# Altium footprint library MyPcbLib.PcbLib: 657 footprints (part 32 of 42)
Each footprint in its own frame and in the unit in brackets; x right, y up, seen from the top. Pads: shape width x height; smd on the part's side, far side on the other; paste and mask are expansions set on the pad; w line width, h text height; cw(c..) or ccw(c..) is an arc to the next point about the centre after c.
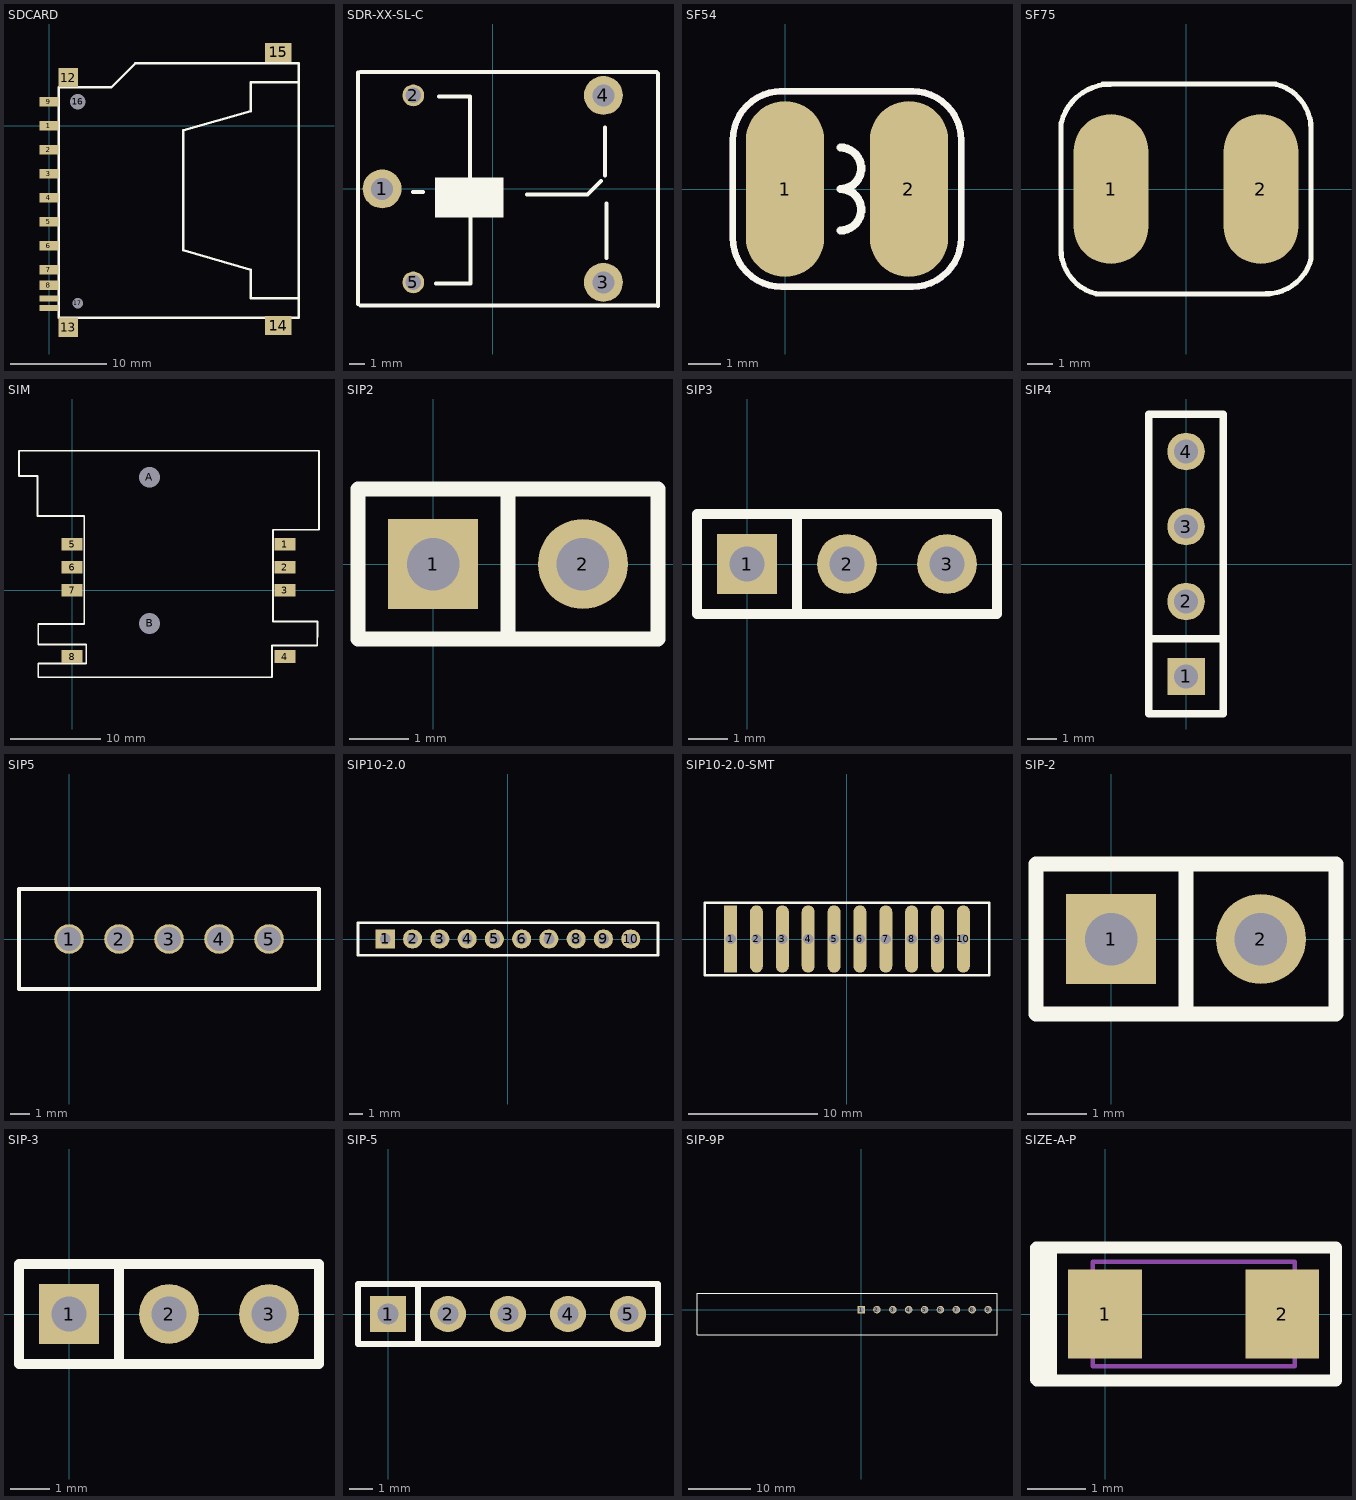
[diagram p31: the footprints below, top view; thin cyan lines are the x and y axes]

## SDCARD [mm]
pads (17):
  rect 2x1 smd: 1(-0.002,0.003) 2(-0.002,-2.497) 3(-0.002,-4.997) 4(-0.002,-7.497) 5(-0.002,-9.997) 6(-0.002,-12.497) 7(-0.002,-14.997) 8(-0.002,-16.622) 9(-0.002,2.503)
  rect 2x0.6 smd: 10(-0.002,-18.997) 11(-0.002,-17.997)
  rect 2x2 smd: 12(1.998,5.003) 13(1.998,-20.997)
  rect 2.8x2 smd: 14(23.874,-20.825) 15(23.874,7.623)
  round 1.5 hole 1.6: 16(2.998,2.503)
  round 1 hole 1.1: 17(2.998,-18.497)
Top Overlay:
  lines w0.254: 25.998,-17.997 20.998,-17.997 20.998,-14.997 13.998,-12.997 13.998,-0.497 20.998,1.503 20.998,4.503 25.998,4.503 ; 0.998,-19.997 25.998,-19.997 25.998,6.503 8.998,6.503 6.498,4.003 0.998,4.003 0.998,-19.997

## SDR-XX-SL-C [mm]
pads (5):
  round 2.5 hole 1.4: 1(-7.1,0) 3(7.1,-6) 4(7.1,6)
  round 1.4 hole 1: 2(-5.1,6) 5(-5.1,-6)
Top Overlay:
  rectangle: -3.708,-1.854 0.686,0.737
  lines w0.254: -8.649,-7.391 -8.649,7.468 ; -8.5,-7.5 10.5,-7.5 ; -8.5,7.5 10.5,7.5 ; -5.131,-0.203 -4.47,-0.203 ; -3.658,-6.071 -1.422,-6.071 -1.422,-1.168 ; -3.454,5.918 -1.473,5.918 -1.473,0.483 ; 2.184,-0.356 5.436,-0.356 ; 5.512,-0.356 6.071,-0.356 6.934,0.508 ; 7.214,0.864 7.214,3.937 ; 7.29,-4.445 7.29,-0.94 ; 10.604,-7.518 10.604,7.417
3D body: height 2.4, standoff -15.9, extent -8.661,-7.753 10.439,7.747

## SF54 [mm]
pads (2):
  oval 2.4x5.4 smd: 1(0,0) 2(3.8,0)
Top Overlay:
  lines w0.2: -1.6,-1.5 ccw(c-0.1,-1.5) -0.1,-3 3.9,-3 ; -1.6,1.5 cw(c-0.1,1.5) -0.1,3 ; 3.9,-2.999 ccw(c3.9,-1.5) 5.399,-1.5 ; 3.9,3 cw(c3.9,1.5) 5.4,1.5 5.4,-1.5
  lines w0.203: -1.6,-1.5 -1.6,1.5 ; -0.15,3 3.914,3
  lines w0.254: 1.7,-1.27 ccw(c1.7,-0.635) 1.7,0 ccw(c1.7,0.635) 1.7,1.27
Mechanical 1:
  lines w0.2: -1.6,-1.5 ccw(c-0.1,-1.5) -0.1,-3 3.9,-3 ; -1.6,1.5 cw(c-0.1,1.5) -0.1,3 ; 3.9,-2.999 ccw(c3.9,-1.5) 5.399,-1.5 ; 3.9,3 cw(c3.9,1.5) 5.4,1.5 5.4,-1.5
  lines w0.203: -1.6,-1.5 -1.6,1.5 ; -0.15,3 3.914,3

## SF75 [mm]
pads (2):
  oval 3x6 smd: 1(-3,0) 2(3,0)
Top Overlay:
  lines w0.2: -5.004,2.642 -5,-2.456 ; 5,-2.759 5,2.383
  lines w0.203: -5.004,-2.388 ccw(c-3.144,-2.39) -3.607,-4.191 ; -4.987,2.663 cw(c-3.018,2.157) -3.015,4.19 ; -3.556,-4.2 3.332,-4.2 ; -3.332,4.2 3.581,4.2 ; 3.2,-4.191 ccw(c3.203,-2.332) 5.004,-2.794 ; 3.607,4.191 cw(c3.144,2.39) 5.004,2.388
3D body: height 3.6, standoff -0.02, extent -3.746,-3.5 3.746,3.5

## SIM [mm]
pads (10):
  rect 2.3x1.4 smd: 1(23.5,5.08) 2(23.5,2.54) 3(23.5,0) 4(23.5,-7.32) 5(0,5.08) 6(0,2.54) 7(0,0) 8(0,-7.32)
  round 1.524 hole 2.3: A(8.55,12.48) B(8.55,-3.66)
Top Overlay:
  lines w0.203: -5.869,12.624 -5.869,15.409 27.273,15.409 27.273,6.683 22.178,6.683 22.178,-3.464 27.094,-3.464 27.094,-5.177 27.086,-5.177 27.086,-6.096 22.086,-6.096 22.086,-9.607 -3.734,-9.607 -3.734,-8.094 1.559,-8.094 1.559,-5.988 -3.734,-5.988 -3.734,-3.719 1.337,-3.719 1.337,8.19 -3.836,8.19 -3.836,12.624 -5.869,12.624

## SIP2 [mil]
pads (2):
  rect 60x60 hole 35: 1(0,0)
  round 60 hole 35: 2(100,0)
Top Overlay:
  lines w10: 50,-50 50,50 ; -50,-50 -50,50 150,50 150,-50 -50,-50

## SIP3 [mil]
pads (3):
  rect 60x60 hole 35: 1(0,0)
  round 60 hole 35: 2(100,0) 3(200,0)
Top Overlay:
  lines w10: 50,-50 50,50 ; -50,-50 250,-50 250,50 -50,50 -50,-50

## SIP4 [mil]
pads (4):
  rect 50x50 hole 32: 1(0,-150)
  round 50 hole 32: 2(0,-50) 3(0,50) 4(0,150)
Top Overlay:
  lines w10: -50,-100 50,-100 ; -50,-200 -50,200 50,200 50,-200 -50,-200
3D body: height 336.22, standoff -118.11, extent -46,-198 54,202

## SIP5 [mm]
pads (5):
  round 1.5 hole 1.2: 1(0,0) 2(2.54,0) 3(5.08,0) 4(7.62,0) 5(10.16,0)
Top Overlay:
  lines w0.203: -2.54,-2.54 -2.54,2.54 12.7,2.54 12.7,-2.54 -2.54,-2.54

## SIP10-2.0 [mm]
pads (10):
  rect 1.4x1.4 hole 0.8: 1(-9,0)
  round 1.4 hole 0.8: 2(-7,0) 3(-5,0) 4(-3,0) 5(-1,0) 6(1,0) 7(3,0) 8(5,0) 9(7,0) 10(9,0)
Top Overlay:
  lines w0.203: -11,-1.2 -11,1.2 11,1.2 11,-1.2 -11,-1.2

## SIP10-2.0-SMT [mm]
pads (10):
  rect 1x5.2 / inner rect 1x5.2 / far side rect 1x1 hole 0.8: 1(-9,0)
  oval 1x5.2 / inner oval 1x5.2 / far side round 1 hole 0.8: 2(-7,0) 3(-5,0) 4(-3,0) 5(-1,0) 6(1,0) 7(3,0) 8(5,0) 9(7,0) 10(9,0)
Top Overlay:
  lines w0.203: -11,-2.8 11,-2.8 11,2.8 -11,2.8 -11,-2.8

## SIP-2 [mil]
height 150
pads (2):
  rect 60x60 hole 35: 1(0,0)
  round 60 hole 35: 2(100,0)
Top Overlay:
  lines w10: 50,-50 50,50 ; -50,-50 150,-50 150,50 -50,50 -50,-50

## SIP-3 [mil]
height 9.5
pads (3):
  rect 60x60 hole 35: 1(0,0)
  round 60 hole 35: 2(100,0) 3(200,0)
Top Overlay:
  lines w10: 50,-50 50,50 ; -50,-50 -50,50 250,50 250,-50 -50,-50

## SIP-5 [mil]
pads (5):
  rect 60x60 hole 35: 1(0,0)
  round 60 hole 35: 2(100,0) 3(200,0) 4(300,0) 5(400,0)
Top Overlay:
  lines w10: 50,-50 50,50 ; -50,-50 450,-50 450,50 -50,50 -50,-50

## SIP-9P [mm]
pads (9):
  rect 1.2x1.2 hole 0.889: 1(0,0)
  round 1.2 hole 0.889: 2(2.54,0) 3(5.08,0) 4(7.62,0) 5(10.16,0) 6(12.7,0) 7(15.24,0) 8(17.78,0) 9(20.32,0)
Top Overlay:
  lines w0.2: -26.25,-4 -26.25,2.62 21.75,2.62 21.75,-4 -26.25,-4

## SIZE-A-P [mil]
pads (2):
  rect 50x60 smd: 1(0,0) 2(120,0)
Top Overlay:
  rectangle: -46.73,-45 -36.5,45
  lines w8: -46.85,-44.49 -46.85,44.88 -46.73,45 -36.5,45 ; -46.34,-45 -36.5,-45 ; -36.5,-45 -36.5,0 -36.5,45 ; -36.5,-45 156.5,-45 156.5,45 -36.5,45
Mechanical 1:
  lines w3: -8.5,-35.5 -8.5,0 -8.5,35.5 128.5,35.5 128.5,-35.5 -8.5,-35.5